# Altium schematic symbol library CMOS.SchLib: 1073 symbols (part 2 of 4) (continued)
## IRFK3D350
designator Q?
N-Channel MOSFET
simulation model IRFK3D350 (SUBCKT)
pins: 1 D (in), 2 G (in), 3 S (in)
1 alternate drawing of the same symbol

## IRFK3D450
designator Q?
N-Channel MOSFET
simulation model IRFK3D450 (SUBCKT)
pins: 1 D (in), 2 G (in), 3 S (in)
1 alternate drawing of the same symbol

## IRFK3DC50
designator Q?
N-Channel MOSFET
simulation model IRFK3DC50 (SUBCKT)
pins: 1 D (in), 2 G (in), 3 S (in)
1 alternate drawing of the same symbol

## IRFK3F150
designator Q?
N-Channel MOSFET
simulation model IRFK3F150 (SUBCKT)
pins: 1 D (in), 2 G (in), 3 S (in)
1 alternate drawing of the same symbol

## IRFK3F250
designator Q?
N-Channel MOSFET
simulation model IRFK3F250 (SUBCKT)
pins: 1 D (in), 2 G (in), 3 S (in)
1 alternate drawing of the same symbol

## IRFK3F350
designator Q?
N-Channel MOSFET
simulation model IRFK3F350 (SUBCKT)
pins: 1 D (in), 2 G (in), 3 S (in)
1 alternate drawing of the same symbol

## IRFK3F450
designator Q?
N-Channel MOSFET
simulation model IRFK3F450 (SUBCKT)
pins: 1 D (in), 2 G (in), 3 S (in)
1 alternate drawing of the same symbol

## IRFK3FC50
designator Q?
N-Channel MOSFET
simulation model IRFK3FC50 (SUBCKT)
pins: 1 D (in), 2 G (in), 3 S (in)
1 alternate drawing of the same symbol

## IRFK4H054
designator Q?
N-Channel MOSFET
simulation model IRFK4H054 (SUBCKT)
pins: 1 D (in), 2 G (in), 3 S (in)
1 alternate drawing of the same symbol

## IRFK4H150
designator Q?
N-Channel MOSFET
simulation model IRFK4H150 (SUBCKT)
pins: 1 D (in), 2 G (in), 3 S (in)
1 alternate drawing of the same symbol

## IRFK4H250
designator Q?
N-Channel MOSFET
simulation model IRFK4H250 (SUBCKT)
pins: 1 D (in), 2 G (in), 3 S (in)
1 alternate drawing of the same symbol

## IRFK4H350
designator Q?
N-Channel MOSFET
simulation model IRFK4H350 (SUBCKT)
pins: 1 D (in), 2 G (in), 3 S (in)
1 alternate drawing of the same symbol

## IRFK4H450
designator Q?
N-Channel MOSFET
simulation model IRFK4H450 (SUBCKT)
pins: 1 D (in), 2 G (in), 3 S (in)
1 alternate drawing of the same symbol

## IRFK4HC50
designator Q?
N-Channel MOSFET
simulation model IRFK4HC50 (SUBCKT)
pins: 1 D (in), 2 G (in), 3 S (in)
1 alternate drawing of the same symbol

## IRFK4HE50
designator Q?
N-Channel MOSFET
simulation model IRFK4HE50 (SUBCKT)
pins: 1 D (in), 2 G (in), 3 S (in)
1 alternate drawing of the same symbol

## IRFK4J054
designator Q?
N-Channel MOSFET
simulation model IRFK4J054 (SUBCKT)
pins: 1 D (in), 2 G (in), 3 S (in)
1 alternate drawing of the same symbol

## IRFK4J150
designator Q?
N-Channel MOSFET
simulation model IRFK4J150 (SUBCKT)
pins: 1 D (in), 2 G (in), 3 S (in)
1 alternate drawing of the same symbol

## IRFK4J250
designator Q?
N-Channel MOSFET
simulation model IRFK4J250 (SUBCKT)
pins: 1 D (in), 2 G (in), 3 S (in)
1 alternate drawing of the same symbol

## IRFK4J350
designator Q?
N-Channel MOSFET
simulation model IRFK4J350 (SUBCKT)
pins: 1 D (in), 2 G (in), 3 S (in)
1 alternate drawing of the same symbol

## IRFK4J450
designator Q?
N-Channel MOSFET
simulation model IRFK4J450 (SUBCKT)
pins: 1 D (in), 2 G (in), 3 S (in)
1 alternate drawing of the same symbol

## IRFK4JC50
designator Q?
N-Channel MOSFET
simulation model IRFK4JC50 (SUBCKT)
pins: 1 D (in), 2 G (in), 3 S (in)
1 alternate drawing of the same symbol

## IRFK4JE50
designator Q?
N-Channel MOSFET
simulation model IRFK4JE50 (SUBCKT)
pins: 1 D (in), 2 G (in), 3 S (in)
1 alternate drawing of the same symbol

## IRFK6H054
designator Q?
N-Channel MOSFET
simulation model IRFK6H054 (SUBCKT)
pins: 1 D (in), 2 G (in), 3 S (in)
1 alternate drawing of the same symbol

## IRFK6H150
designator Q?
N-Channel MOSFET
simulation model IRFK6H150 (SUBCKT)
pins: 1 D (in), 2 G (in), 3 S (in)
1 alternate drawing of the same symbol

## IRFK6H250
designator Q?
N-Channel MOSFET
simulation model IRFK6H250 (SUBCKT)
pins: 1 D (in), 2 G (in), 3 S (in)
1 alternate drawing of the same symbol

## IRFK6H350
designator Q?
N-Channel MOSFET
simulation model IRFK6H350 (SUBCKT)
pins: 1 D (in), 2 G (in), 3 S (in)
1 alternate drawing of the same symbol

## IRFK6H450
designator Q?
N-Channel MOSFET
simulation model IRFK6H450 (SUBCKT)
pins: 1 D (in), 2 G (in), 3 S (in)
1 alternate drawing of the same symbol

## IRFK6HC50
designator Q?
N-Channel MOSFET
simulation model IRFK6HC50 (SUBCKT)
pins: 1 D (in), 2 G (in), 3 S (in)
1 alternate drawing of the same symbol

## IRFK6J054
designator Q?
N-Channel MOSFET
simulation model IRFK6J054 (SUBCKT)
pins: 1 D (in), 2 G (in), 3 S (in)
1 alternate drawing of the same symbol

## IRFK6J150
designator Q?
N-Channel MOSFET
simulation model IRFK6J150 (SUBCKT)
pins: 1 D (in), 2 G (in), 3 S (in)
1 alternate drawing of the same symbol

## IRFK6J250
designator Q?
N-Channel MOSFET
simulation model IRFK6J250 (SUBCKT)
pins: 1 D (in), 2 G (in), 3 S (in)
1 alternate drawing of the same symbol

## IRFK6J350
designator Q?
N-Channel MOSFET
simulation model IRFK6J350 (SUBCKT)
pins: 1 D (in), 2 G (in), 3 S (in)
1 alternate drawing of the same symbol

## IRFK6J450
designator Q?
N-Channel MOSFET
simulation model IRFK6J450 (SUBCKT)
pins: 1 D (in), 2 G (in), 3 S (in)
1 alternate drawing of the same symbol

## IRFK6JC50
designator Q?
N-Channel MOSFET
simulation model IRFK6JC50 (SUBCKT)
pins: 1 D (in), 2 G (in), 3 S (in)
1 alternate drawing of the same symbol

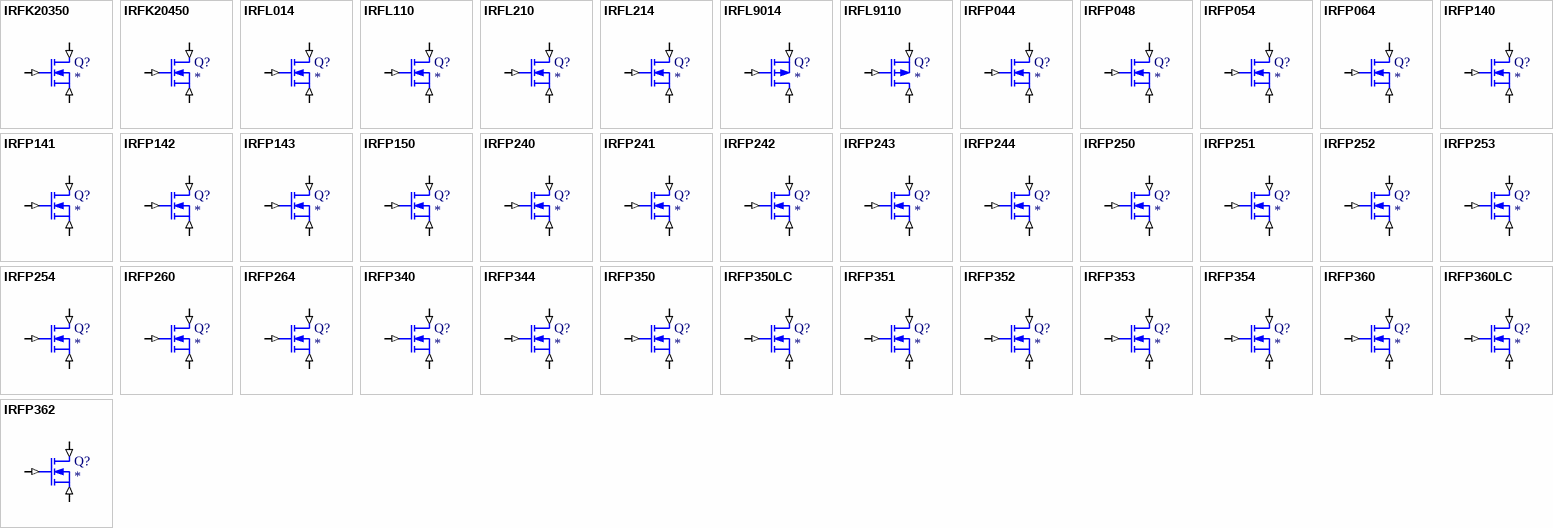
[diagram p13: symbols IRFK20350 to IRFP362]

## IRFK20350
designator Q?
N-Channel MOSFET
simulation model IRFK20350 (SUBCKT)
pins: 1 D (in), 2 G (in), 3 S (in)
1 alternate drawing of the same symbol

## IRFK20450
designator Q?
N-Channel MOSFET
simulation model IRFK20450 (SUBCKT)
pins: 1 D (in), 2 G (in), 3 S (in)
1 alternate drawing of the same symbol

## IRFL014
designator Q?
N-Channel MOSFET
simulation model IRFL014 (SUBCKT)
pins: 1 D (in), 2 G (in), 3 S (in)
1 alternate drawing of the same symbol

## IRFL110
designator Q?
N-Channel MOSFET
simulation model IRFL110 (SUBCKT)
pins: 1 D (in), 2 G (in), 3 S (in)
1 alternate drawing of the same symbol

## IRFL210
designator Q?
N-Channel MOSFET
simulation model IRFL210 (SUBCKT)
pins: 1 D (in), 2 G (in), 3 S (in)
1 alternate drawing of the same symbol

## IRFL214
designator Q?
N-Channel MOSFET
simulation model IRFL214 (SUBCKT)
pins: 1 D (in), 2 G (in), 3 S (in)
1 alternate drawing of the same symbol

## IRFL9014
designator Q?
P-Channel MOSFET
simulation model IRFL9014 (SUBCKT)
pins: 1 D (in), 2 G (in), 3 S (in)
1 alternate drawing of the same symbol

## IRFL9110
designator Q?
P-Channel MOSFET
simulation model IRFL9110 (SUBCKT)
pins: 1 D (in), 2 G (in), 3 S (in)
1 alternate drawing of the same symbol

## IRFP044
designator Q?
N-Channel MOSFET
simulation model IRFP044 (SUBCKT)
pins: 1 D (in), 2 G (in), 3 S (in)
1 alternate drawing of the same symbol

## IRFP048
designator Q?
N-Channel MOSFET
simulation model IRFP048 (SUBCKT)
pins: 1 D (in), 2 G (in), 3 S (in)
1 alternate drawing of the same symbol

## IRFP054
designator Q?
N-Channel MOSFET
simulation model IRFP054 (SUBCKT)
pins: 1 D (in), 2 G (in), 3 S (in)
1 alternate drawing of the same symbol

## IRFP064
designator Q?
N-Channel MOSFET
simulation model IRFP064 (SUBCKT)
pins: 1 D (in), 2 G (in), 3 S (in)
1 alternate drawing of the same symbol

## IRFP140
designator Q?
N-Channel MOSFET
simulation model IRFP140 (SUBCKT)
pins: 1 D (in), 2 G (in), 3 S (in)
1 alternate drawing of the same symbol

## IRFP141
designator Q?
N-Channel MOSFET
simulation model IRFP141 (SUBCKT)
pins: 1 D (in), 2 G (in), 3 S (in)
1 alternate drawing of the same symbol

## IRFP142
designator Q?
N-Channel MOSFET
simulation model IRFP142 (SUBCKT)
pins: 1 D (in), 2 G (in), 3 S (in)
1 alternate drawing of the same symbol

## IRFP143
designator Q?
N-Channel MOSFET
simulation model IRFP143 (SUBCKT)
pins: 1 D (in), 2 G (in), 3 S (in)
1 alternate drawing of the same symbol

## IRFP150
designator Q?
N-Channel MOSFET
simulation model IRFP150 (SUBCKT)
pins: 1 D (in), 2 G (in), 3 S (in)
1 alternate drawing of the same symbol

## IRFP240
designator Q?
N-Channel MOSFET
simulation model IRFP240 (SUBCKT)
pins: 1 D (in), 2 G (in), 3 S (in)
1 alternate drawing of the same symbol

## IRFP241
designator Q?
N-Channel MOSFET
simulation model IRFP241 (SUBCKT)
pins: 1 D (in), 2 G (in), 3 S (in)
1 alternate drawing of the same symbol

## IRFP242
designator Q?
N-Channel MOSFET
simulation model IRFP242 (SUBCKT)
pins: 1 D (in), 2 G (in), 3 S (in)
1 alternate drawing of the same symbol

## IRFP243
designator Q?
N-Channel MOSFET
simulation model IRFP243 (SUBCKT)
pins: 1 D (in), 2 G (in), 3 S (in)
1 alternate drawing of the same symbol

## IRFP244
designator Q?
N-Channel MOSFET
simulation model IRFP244 (SUBCKT)
pins: 1 D (in), 2 G (in), 3 S (in)
1 alternate drawing of the same symbol

## IRFP250
designator Q?
N-Channel MOSFET
simulation model IRFP250 (SUBCKT)
pins: 1 D (in), 2 G (in), 3 S (in)
1 alternate drawing of the same symbol

## IRFP251
designator Q?
N-Channel MOSFET
simulation model IRFP251 (SUBCKT)
pins: 1 D (in), 2 G (in), 3 S (in)
1 alternate drawing of the same symbol

## IRFP252
designator Q?
N-Channel MOSFET
simulation model IRFP252 (SUBCKT)
pins: 1 D (in), 2 G (in), 3 S (in)
1 alternate drawing of the same symbol

## IRFP253
designator Q?
N-Channel MOSFET
simulation model IRFP253 (SUBCKT)
pins: 1 D (in), 2 G (in), 3 S (in)
1 alternate drawing of the same symbol

## IRFP254
designator Q?
N-Channel MOSFET
simulation model IRFP254 (SUBCKT)
pins: 1 D (in), 2 G (in), 3 S (in)
1 alternate drawing of the same symbol

## IRFP260
designator Q?
N-Channel MOSFET
simulation model IRFP260 (SUBCKT)
pins: 1 D (in), 2 G (in), 3 S (in)
1 alternate drawing of the same symbol

## IRFP264
designator Q?
N-Channel MOSFET
simulation model IRFP264 (SUBCKT)
pins: 1 D (in), 2 G (in), 3 S (in)
1 alternate drawing of the same symbol

## IRFP340
designator Q?
N-Channel MOSFET
simulation model IRFP340 (SUBCKT)
pins: 1 D (in), 2 G (in), 3 S (in)
1 alternate drawing of the same symbol

## IRFP344
designator Q?
N-Channel MOSFET
simulation model IRFP344 (SUBCKT)
pins: 1 D (in), 2 G (in), 3 S (in)
1 alternate drawing of the same symbol

## IRFP350
designator Q?
N-Channel MOSFET
simulation model IRFP350 (SUBCKT)
pins: 1 D (in), 2 G (in), 3 S (in)
1 alternate drawing of the same symbol

## IRFP350LC
designator Q?
N-Channel MOSFET
simulation model IRFP350LC (SUBCKT)
pins: 1 D (in), 2 G (in), 3 S (in)
1 alternate drawing of the same symbol

## IRFP351
designator Q?
N-Channel MOSFET
simulation model IRFP351 (SUBCKT)
pins: 1 D (in), 2 G (in), 3 S (in)
1 alternate drawing of the same symbol

## IRFP352
designator Q?
N-Channel MOSFET
simulation model IRFP352 (SUBCKT)
pins: 1 D (in), 2 G (in), 3 S (in)
1 alternate drawing of the same symbol

## IRFP353
designator Q?
N-Channel MOSFET
simulation model IRFP353 (SUBCKT)
pins: 1 D (in), 2 G (in), 3 S (in)
1 alternate drawing of the same symbol

## IRFP354
designator Q?
N-Channel MOSFET
simulation model IRFP354 (SUBCKT)
pins: 1 D (in), 2 G (in), 3 S (in)
1 alternate drawing of the same symbol

## IRFP360
designator Q?
N-Channel MOSFET
simulation model IRFP360 (SUBCKT)
pins: 1 D (in), 2 G (in), 3 S (in)
1 alternate drawing of the same symbol

## IRFP360LC
designator Q?
N-Channel MOSFET
simulation model IRFP360LC (SUBCKT)
pins: 1 D (in), 2 G (in), 3 S (in)
1 alternate drawing of the same symbol

## IRFP362
designator Q?
N-Channel MOSFET
simulation model IRFP362 (SUBCKT)
pins: 1 D (in), 2 G (in), 3 S (in)
1 alternate drawing of the same symbol

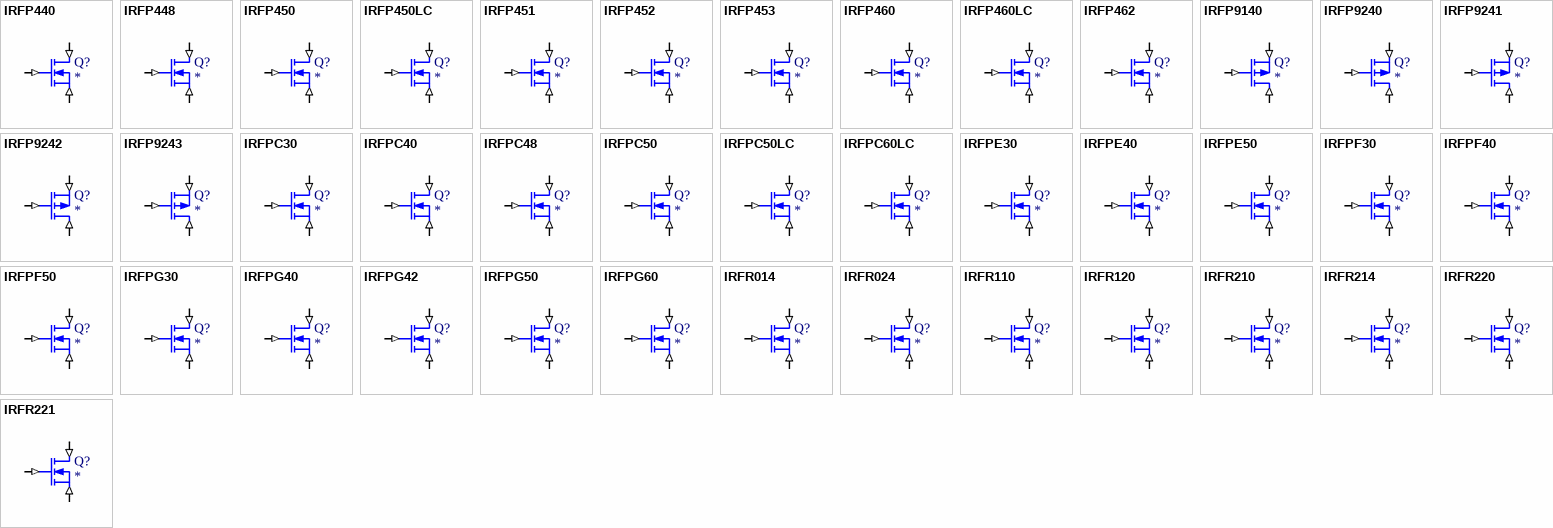
[diagram p14: symbols IRFP440 to IRFR221]

## IRFP440
designator Q?
N-Channel MOSFET
simulation model IRFP440 (SUBCKT)
pins: 1 D (in), 2 G (in), 3 S (in)
1 alternate drawing of the same symbol

## IRFP448
designator Q?
N-Channel MOSFET
simulation model IRFP448 (SUBCKT)
pins: 1 D (in), 2 G (in), 3 S (in)
1 alternate drawing of the same symbol

## IRFP450
designator Q?
N-Channel MOSFET
simulation model IRFP450 (SUBCKT)
pins: 1 D (in), 2 G (in), 3 S (in)
1 alternate drawing of the same symbol

## IRFP450LC
designator Q?
N-Channel MOSFET
simulation model IRFP450LC (SUBCKT)
pins: 1 D (in), 2 G (in), 3 S (in)
1 alternate drawing of the same symbol

## IRFP451
designator Q?
N-Channel MOSFET
simulation model IRFP451 (SUBCKT)
pins: 1 D (in), 2 G (in), 3 S (in)
1 alternate drawing of the same symbol

## IRFP452
designator Q?
N-Channel MOSFET
simulation model IRFP452 (SUBCKT)
pins: 1 D (in), 2 G (in), 3 S (in)
1 alternate drawing of the same symbol

## IRFP453
designator Q?
N-Channel MOSFET
simulation model IRFP453 (SUBCKT)
pins: 1 D (in), 2 G (in), 3 S (in)
1 alternate drawing of the same symbol

## IRFP460
designator Q?
N-Channel MOSFET
simulation model IRFP460 (SUBCKT)
pins: 1 D (in), 2 G (in), 3 S (in)
1 alternate drawing of the same symbol

## IRFP460LC
designator Q?
N-Channel MOSFET
simulation model IRFP460LC (SUBCKT)
pins: 1 D (in), 2 G (in), 3 S (in)
1 alternate drawing of the same symbol

## IRFP462
designator Q?
N-Channel MOSFET
simulation model IRFP462 (SUBCKT)
pins: 1 D (in), 2 G (in), 3 S (in)
1 alternate drawing of the same symbol

## IRFP9140
designator Q?
P-Channel MOSFET
simulation model IRFP9140 (SUBCKT)
pins: 1 D (in), 2 G (in), 3 S (in)
1 alternate drawing of the same symbol

## IRFP9240
designator Q?
P-Channel MOSFET
simulation model IRFP9240 (SUBCKT)
pins: 1 D (in), 2 G (in), 3 S (in)
1 alternate drawing of the same symbol

## IRFP9241
designator Q?
P-Channel MOSFET
simulation model IRFP9241 (SUBCKT)
pins: 1 D (in), 2 G (in), 3 S (in)
1 alternate drawing of the same symbol

## IRFP9242
designator Q?
P-Channel MOSFET
simulation model IRFP9242 (SUBCKT)
pins: 1 D (in), 2 G (in), 3 S (in)
1 alternate drawing of the same symbol

## IRFP9243
designator Q?
P-Channel MOSFET
simulation model IRFP9243 (SUBCKT)
pins: 1 D (in), 2 G (in), 3 S (in)
1 alternate drawing of the same symbol

## IRFPC30
designator Q?
N-Channel MOSFET
simulation model IRFPC30 (SUBCKT)
pins: 1 D (in), 2 G (in), 3 S (in)
1 alternate drawing of the same symbol

## IRFPC40
designator Q?
N-Channel MOSFET
simulation model IRFPC40 (SUBCKT)
pins: 1 D (in), 2 G (in), 3 S (in)
1 alternate drawing of the same symbol

## IRFPC48
designator Q?
N-Channel MOSFET
simulation model IRFPC48 (SUBCKT)
pins: 1 D (in), 2 G (in), 3 S (in)
1 alternate drawing of the same symbol

## IRFPC50
designator Q?
N-Channel MOSFET
simulation model IRFPC50 (SUBCKT)
pins: 1 D (in), 2 G (in), 3 S (in)
1 alternate drawing of the same symbol

## IRFPC50LC
designator Q?
N-Channel MOSFET
simulation model IRFPC50LC (SUBCKT)
pins: 1 D (in), 2 G (in), 3 S (in)
1 alternate drawing of the same symbol

## IRFPC60LC
designator Q?
N-Channel MOSFET
simulation model IRFPC60LC (SUBCKT)
pins: 1 D (in), 2 G (in), 3 S (in)
1 alternate drawing of the same symbol

## IRFPE30
designator Q?
N-Channel MOSFET
simulation model IRFPE30 (SUBCKT)
pins: 1 D (in), 2 G (in), 3 S (in)
1 alternate drawing of the same symbol

## IRFPE40
designator Q?
N-Channel MOSFET
simulation model IRFPE40 (SUBCKT)
pins: 1 D (in), 2 G (in), 3 S (in)
1 alternate drawing of the same symbol

## IRFPE50
designator Q?
N-Channel MOSFET
simulation model IRFPE50 (SUBCKT)
pins: 1 D (in), 2 G (in), 3 S (in)
1 alternate drawing of the same symbol

## IRFPF30
designator Q?
N-Channel MOSFET
simulation model IRFPF30 (SUBCKT)
pins: 1 D (in), 2 G (in), 3 S (in)
1 alternate drawing of the same symbol

## IRFPF40
designator Q?
N-Channel MOSFET
simulation model IRFPF40 (SUBCKT)
pins: 1 D (in), 2 G (in), 3 S (in)
1 alternate drawing of the same symbol

## IRFPF50
designator Q?
N-Channel MOSFET
simulation model IRFPF50 (SUBCKT)
pins: 1 D (in), 2 G (in), 3 S (in)
1 alternate drawing of the same symbol

## IRFPG30
designator Q?
N-Channel MOSFET
simulation model IRFPG30 (SUBCKT)
pins: 1 D (in), 2 G (in), 3 S (in)
1 alternate drawing of the same symbol

## IRFPG40
designator Q?
N-Channel MOSFET
simulation model IRFPG40 (SUBCKT)
pins: 1 D (in), 2 G (in), 3 S (in)
1 alternate drawing of the same symbol

## IRFPG42
designator Q?
N-Channel MOSFET
simulation model IRFPG42 (SUBCKT)
pins: 1 D (in), 2 G (in), 3 S (in)
1 alternate drawing of the same symbol

## IRFPG50
designator Q?
N-Channel MOSFET
simulation model IRFPG50 (SUBCKT)
pins: 1 D (in), 2 G (in), 3 S (in)
1 alternate drawing of the same symbol

## IRFPG60
designator Q?
N-Channel MOSFET
simulation model IRFPG60 (SUBCKT)
pins: 1 D (in), 2 G (in), 3 S (in)
1 alternate drawing of the same symbol

## IRFR014
designator Q?
N-Channel MOSFET
simulation model IRFR014 (SUBCKT)
pins: 1 D (in), 2 G (in), 3 S (in)
1 alternate drawing of the same symbol

## IRFR024
designator Q?
N-Channel MOSFET
simulation model IRFR024 (SUBCKT)
pins: 1 D (in), 2 G (in), 3 S (in)
1 alternate drawing of the same symbol

## IRFR110
designator Q?
N-Channel MOSFET
simulation model IRFR110 (SUBCKT)
pins: 1 D (in), 2 G (in), 3 S (in)
1 alternate drawing of the same symbol

## IRFR120
designator Q?
N-Channel MOSFET
simulation model IRFR120 (SUBCKT)
pins: 1 D (in), 2 G (in), 3 S (in)
1 alternate drawing of the same symbol

## IRFR210
designator Q?
N-Channel MOSFET
simulation model IRFR210 (SUBCKT)
pins: 1 D (in), 2 G (in), 3 S (in)
1 alternate drawing of the same symbol

## IRFR214
designator Q?
N-Channel MOSFET
simulation model IRFR214 (SUBCKT)
pins: 1 D (in), 2 G (in), 3 S (in)
1 alternate drawing of the same symbol

## IRFR220
designator Q?
N-Channel MOSFET
simulation model IRFR220 (SUBCKT)
pins: 1 D (in), 2 G (in), 3 S (in)
1 alternate drawing of the same symbol

## IRFR221
designator Q?
N-Channel MOSFET
simulation model IRFR221 (SUBCKT)
pins: 1 D (in), 2 G (in), 3 S (in)
1 alternate drawing of the same symbol

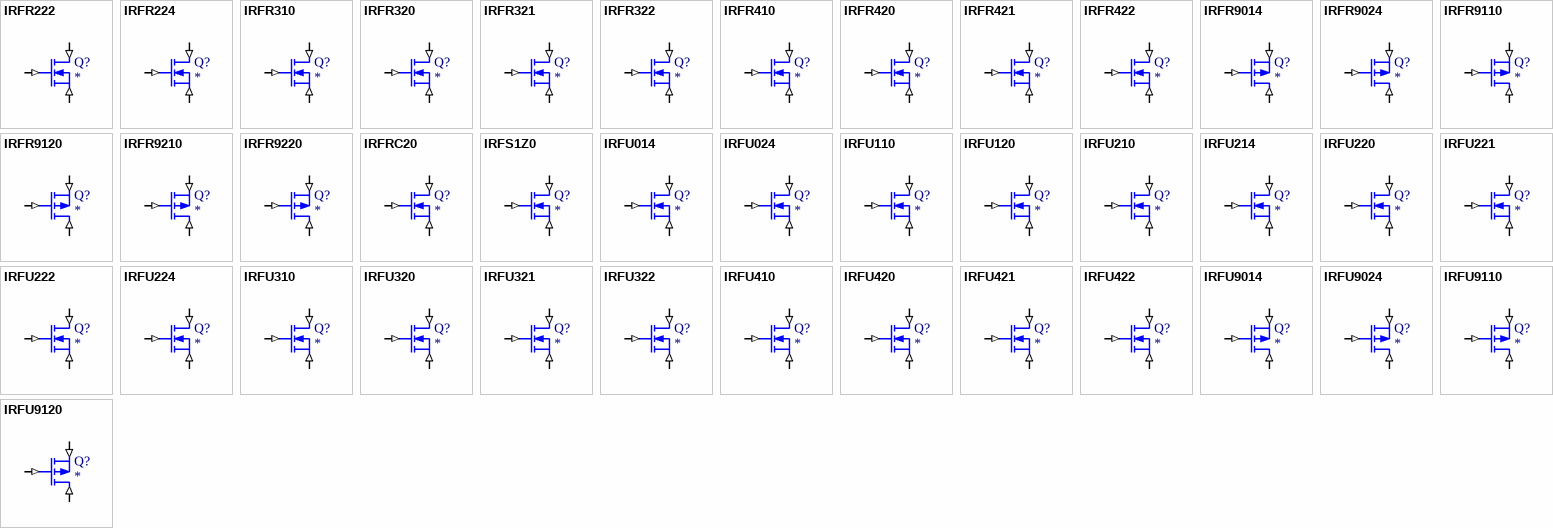
[diagram p15: symbols IRFR222 to IRFU9120]

## IRFR222
designator Q?
N-Channel MOSFET
simulation model IRFR222 (SUBCKT)
pins: 1 D (in), 2 G (in), 3 S (in)
1 alternate drawing of the same symbol

## IRFR224
designator Q?
N-Channel MOSFET
simulation model IRFR224 (SUBCKT)
pins: 1 D (in), 2 G (in), 3 S (in)
1 alternate drawing of the same symbol

## IRFR310
designator Q?
N-Channel MOSFET
simulation model IRFR310 (SUBCKT)
pins: 1 D (in), 2 G (in), 3 S (in)
1 alternate drawing of the same symbol

## IRFR320
designator Q?
N-Channel MOSFET
simulation model IRFR320 (SUBCKT)
pins: 1 D (in), 2 G (in), 3 S (in)
1 alternate drawing of the same symbol

## IRFR321
designator Q?
N-Channel MOSFET
simulation model IRFR321 (SUBCKT)
pins: 1 D (in), 2 G (in), 3 S (in)
1 alternate drawing of the same symbol

## IRFR322
designator Q?
N-Channel MOSFET
simulation model IRFR322 (SUBCKT)
pins: 1 D (in), 2 G (in), 3 S (in)
1 alternate drawing of the same symbol

## IRFR410
designator Q?
N-Channel MOSFET
simulation model IRFR410 (SUBCKT)
pins: 1 D (in), 2 G (in), 3 S (in)
1 alternate drawing of the same symbol

## IRFR420
designator Q?
N-Channel MOSFET
simulation model IRFR420 (SUBCKT)
pins: 1 D (in), 2 G (in), 3 S (in)
1 alternate drawing of the same symbol

## IRFR421
designator Q?
N-Channel MOSFET
simulation model IRFR421 (SUBCKT)
pins: 1 D (in), 2 G (in), 3 S (in)
1 alternate drawing of the same symbol

## IRFR422
designator Q?
N-Channel MOSFET
simulation model IRFR422 (SUBCKT)
pins: 1 D (in), 2 G (in), 3 S (in)
1 alternate drawing of the same symbol

## IRFR9014
designator Q?
P-Channel MOSFET
simulation model IRFR9014 (SUBCKT)
pins: 1 D (in), 2 G (in), 3 S (in)
1 alternate drawing of the same symbol

## IRFR9024
designator Q?
P-Channel MOSFET
simulation model IRFR9024 (SUBCKT)
pins: 1 D (in), 2 G (in), 3 S (in)
1 alternate drawing of the same symbol

## IRFR9110
designator Q?
P-Channel MOSFET
simulation model IRFR9110 (SUBCKT)
pins: 1 D (in), 2 G (in), 3 S (in)
1 alternate drawing of the same symbol

## IRFR9120
designator Q?
P-Channel MOSFET
simulation model IRFR9120 (SUBCKT)
pins: 1 D (in), 2 G (in), 3 S (in)
1 alternate drawing of the same symbol

## IRFR9210
designator Q?
P-Channel MOSFET
simulation model IRFR9210 (SUBCKT)
pins: 1 D (in), 2 G (in), 3 S (in)
1 alternate drawing of the same symbol

## IRFR9220
designator Q?
P-Channel MOSFET
simulation model IRFR9220 (SUBCKT)
pins: 1 D (in), 2 G (in), 3 S (in)
1 alternate drawing of the same symbol

## IRFRC20
designator Q?
N-Channel MOSFET
simulation model IRFRC20 (SUBCKT)
pins: 1 D (in), 2 G (in), 3 S (in)
1 alternate drawing of the same symbol

## IRFS1Z0
designator Q?
N-Channel MOSFET
simulation model IRFS1Z0 (SUBCKT)
pins: 1 D (in), 2 G (in), 3 S (in)
1 alternate drawing of the same symbol

## IRFU014
designator Q?
N-Channel MOSFET
simulation model IRFU014 (SUBCKT)
pins: 1 D (in), 2 G (in), 3 S (in)
1 alternate drawing of the same symbol

## IRFU024
designator Q?
N-Channel MOSFET
simulation model IRFU024 (SUBCKT)
pins: 1 D (in), 2 G (in), 3 S (in)
1 alternate drawing of the same symbol

## IRFU110
designator Q?
N-Channel MOSFET
simulation model IRFU110 (SUBCKT)
pins: 1 D (in), 2 G (in), 3 S (in)
1 alternate drawing of the same symbol

## IRFU120
designator Q?
N-Channel MOSFET
simulation model IRFU120 (SUBCKT)
pins: 1 D (in), 2 G (in), 3 S (in)
1 alternate drawing of the same symbol

## IRFU210
designator Q?
N-Channel MOSFET
simulation model IRFU210 (SUBCKT)
pins: 1 D (in), 2 G (in), 3 S (in)
1 alternate drawing of the same symbol

## IRFU214
designator Q?
N-Channel MOSFET
simulation model IRFU214 (SUBCKT)
pins: 1 D (in), 2 G (in), 3 S (in)
1 alternate drawing of the same symbol

## IRFU220
designator Q?
N-Channel MOSFET
simulation model IRFU220 (SUBCKT)
pins: 1 D (in), 2 G (in), 3 S (in)
1 alternate drawing of the same symbol

## IRFU221
designator Q?
N-Channel MOSFET
simulation model IRFU221 (SUBCKT)
pins: 1 D (in), 2 G (in), 3 S (in)
1 alternate drawing of the same symbol

## IRFU222
designator Q?
N-Channel MOSFET
simulation model IRFU222 (SUBCKT)
pins: 1 D (in), 2 G (in), 3 S (in)
1 alternate drawing of the same symbol

## IRFU224
designator Q?
N-Channel MOSFET
simulation model IRFU224 (SUBCKT)
pins: 1 D (in), 2 G (in), 3 S (in)
1 alternate drawing of the same symbol

## IRFU310
designator Q?
N-Channel MOSFET
simulation model IRFU310 (SUBCKT)
pins: 1 D (in), 2 G (in), 3 S (in)
1 alternate drawing of the same symbol

## IRFU320
designator Q?
N-Channel MOSFET
simulation model IRFU320 (SUBCKT)
pins: 1 D (in), 2 G (in), 3 S (in)
1 alternate drawing of the same symbol

## IRFU321
designator Q?
N-Channel MOSFET
simulation model IRFU321 (SUBCKT)
pins: 1 D (in), 2 G (in), 3 S (in)
1 alternate drawing of the same symbol

## IRFU322
designator Q?
N-Channel MOSFET
simulation model IRFU322 (SUBCKT)
pins: 1 D (in), 2 G (in), 3 S (in)
1 alternate drawing of the same symbol

## IRFU410
designator Q?
N-Channel MOSFET
simulation model IRFU410 (SUBCKT)
pins: 1 D (in), 2 G (in), 3 S (in)
1 alternate drawing of the same symbol

## IRFU420
designator Q?
N-Channel MOSFET
simulation model IRFU420 (SUBCKT)
pins: 1 D (in), 2 G (in), 3 S (in)
1 alternate drawing of the same symbol

## IRFU421
designator Q?
N-Channel MOSFET
simulation model IRFU421 (SUBCKT)
pins: 1 D (in), 2 G (in), 3 S (in)
1 alternate drawing of the same symbol

## IRFU422
designator Q?
N-Channel MOSFET
simulation model IRFU422 (SUBCKT)
pins: 1 D (in), 2 G (in), 3 S (in)
1 alternate drawing of the same symbol

## IRFU9014
designator Q?
P-Channel MOSFET
simulation model IRFU9014 (SUBCKT)
pins: 1 D (in), 2 G (in), 3 S (in)
1 alternate drawing of the same symbol

## IRFU9024
designator Q?
P-Channel MOSFET
simulation model IRFU9024 (SUBCKT)
pins: 1 D (in), 2 G (in), 3 S (in)
1 alternate drawing of the same symbol

## IRFU9110
designator Q?
P-Channel MOSFET
simulation model IRFU9110 (SUBCKT)
pins: 1 D (in), 2 G (in), 3 S (in)
1 alternate drawing of the same symbol

## IRFU9120
designator Q?
P-Channel MOSFET
simulation model IRFU9120 (SUBCKT)
pins: 1 D (in), 2 G (in), 3 S (in)
1 alternate drawing of the same symbol

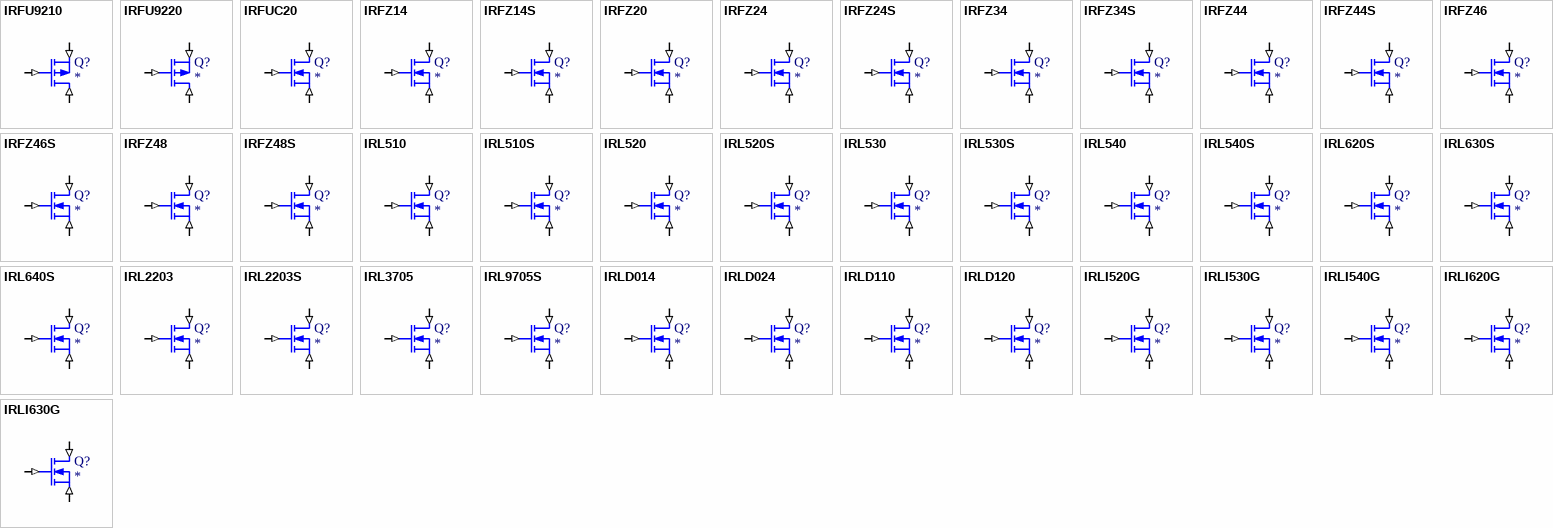
[diagram p16: symbols IRFU9210 to IRLI630G]

## IRFU9210
designator Q?
P-Channel MOSFET
simulation model IRFU9210 (SUBCKT)
pins: 1 D (in), 2 G (in), 3 S (in)
1 alternate drawing of the same symbol

## IRFU9220
designator Q?
P-Channel MOSFET
simulation model IRFU9220 (SUBCKT)
pins: 1 D (in), 2 G (in), 3 S (in)
1 alternate drawing of the same symbol

## IRFUC20
designator Q?
N-Channel MOSFET
simulation model IRFUC20 (SUBCKT)
pins: 1 D (in), 2 G (in), 3 S (in)
1 alternate drawing of the same symbol

## IRFZ14
designator Q?
N-Channel MOSFET
simulation model IRFZ14 (SUBCKT)
pins: 1 D (in), 2 G (in), 3 S (in)
1 alternate drawing of the same symbol

## IRFZ14S
designator Q?
N-Channel MOSFET
simulation model IRFZ14S (SUBCKT)
pins: 1 D (in), 2 G (in), 3 S (in)
1 alternate drawing of the same symbol

## IRFZ20
designator Q?
N-Channel MOSFET
simulation model IRFZ20 (SUBCKT)
pins: 1 D (in), 2 G (in), 3 S (in)
1 alternate drawing of the same symbol

## IRFZ24
designator Q?
N-Channel MOSFET
simulation model IRFZ24 (SUBCKT)
pins: 1 D (in), 2 G (in), 3 S (in)
1 alternate drawing of the same symbol

## IRFZ24S
designator Q?
N-Channel MOSFET
simulation model IRFZ24S (SUBCKT)
pins: 1 D (in), 2 G (in), 3 S (in)
1 alternate drawing of the same symbol

## IRFZ34
designator Q?
N-Channel MOSFET
simulation model IRFZ34 (SUBCKT)
pins: 1 D (in), 2 G (in), 3 S (in)
1 alternate drawing of the same symbol

## IRFZ34S
designator Q?
N-Channel MOSFET
simulation model IRFZ34S (SUBCKT)
pins: 1 D (in), 2 G (in), 3 S (in)
1 alternate drawing of the same symbol

## IRFZ44
designator Q?
N-Channel MOSFET
simulation model IRFZ44 (SUBCKT)
pins: 1 D (in), 2 G (in), 3 S (in)
1 alternate drawing of the same symbol

## IRFZ44S
designator Q?
N-Channel MOSFET
simulation model IRFZ44S (SUBCKT)
pins: 1 D (in), 2 G (in), 3 S (in)
1 alternate drawing of the same symbol

## IRFZ46
designator Q?
N-Channel MOSFET
simulation model IRFZ46 (SUBCKT)
pins: 1 D (in), 2 G (in), 3 S (in)
1 alternate drawing of the same symbol

## IRFZ46S
designator Q?
N-Channel MOSFET
simulation model IRFZ46S (SUBCKT)
pins: 1 D (in), 2 G (in), 3 S (in)
1 alternate drawing of the same symbol

## IRFZ48
designator Q?
N-Channel MOSFET
simulation model IRFZ48 (SUBCKT)
pins: 1 D (in), 2 G (in), 3 S (in)
1 alternate drawing of the same symbol

## IRFZ48S
designator Q?
N-Channel MOSFET
simulation model IRFZ48S (SUBCKT)
pins: 1 D (in), 2 G (in), 3 S (in)
1 alternate drawing of the same symbol